# Altium footprint library JEDEC_G.PcbLib: 194 footprints (part 6 of 13)
Each footprint in its own frame and in the unit in brackets; x right, y up, seen from the top. Pads: shape width x height; smd on the part's side, far side on the other; paste and mask are expansions set on the pad; w line width, h text height; cw(c..) or ccw(c..) is an arc to the next point about the centre after c.
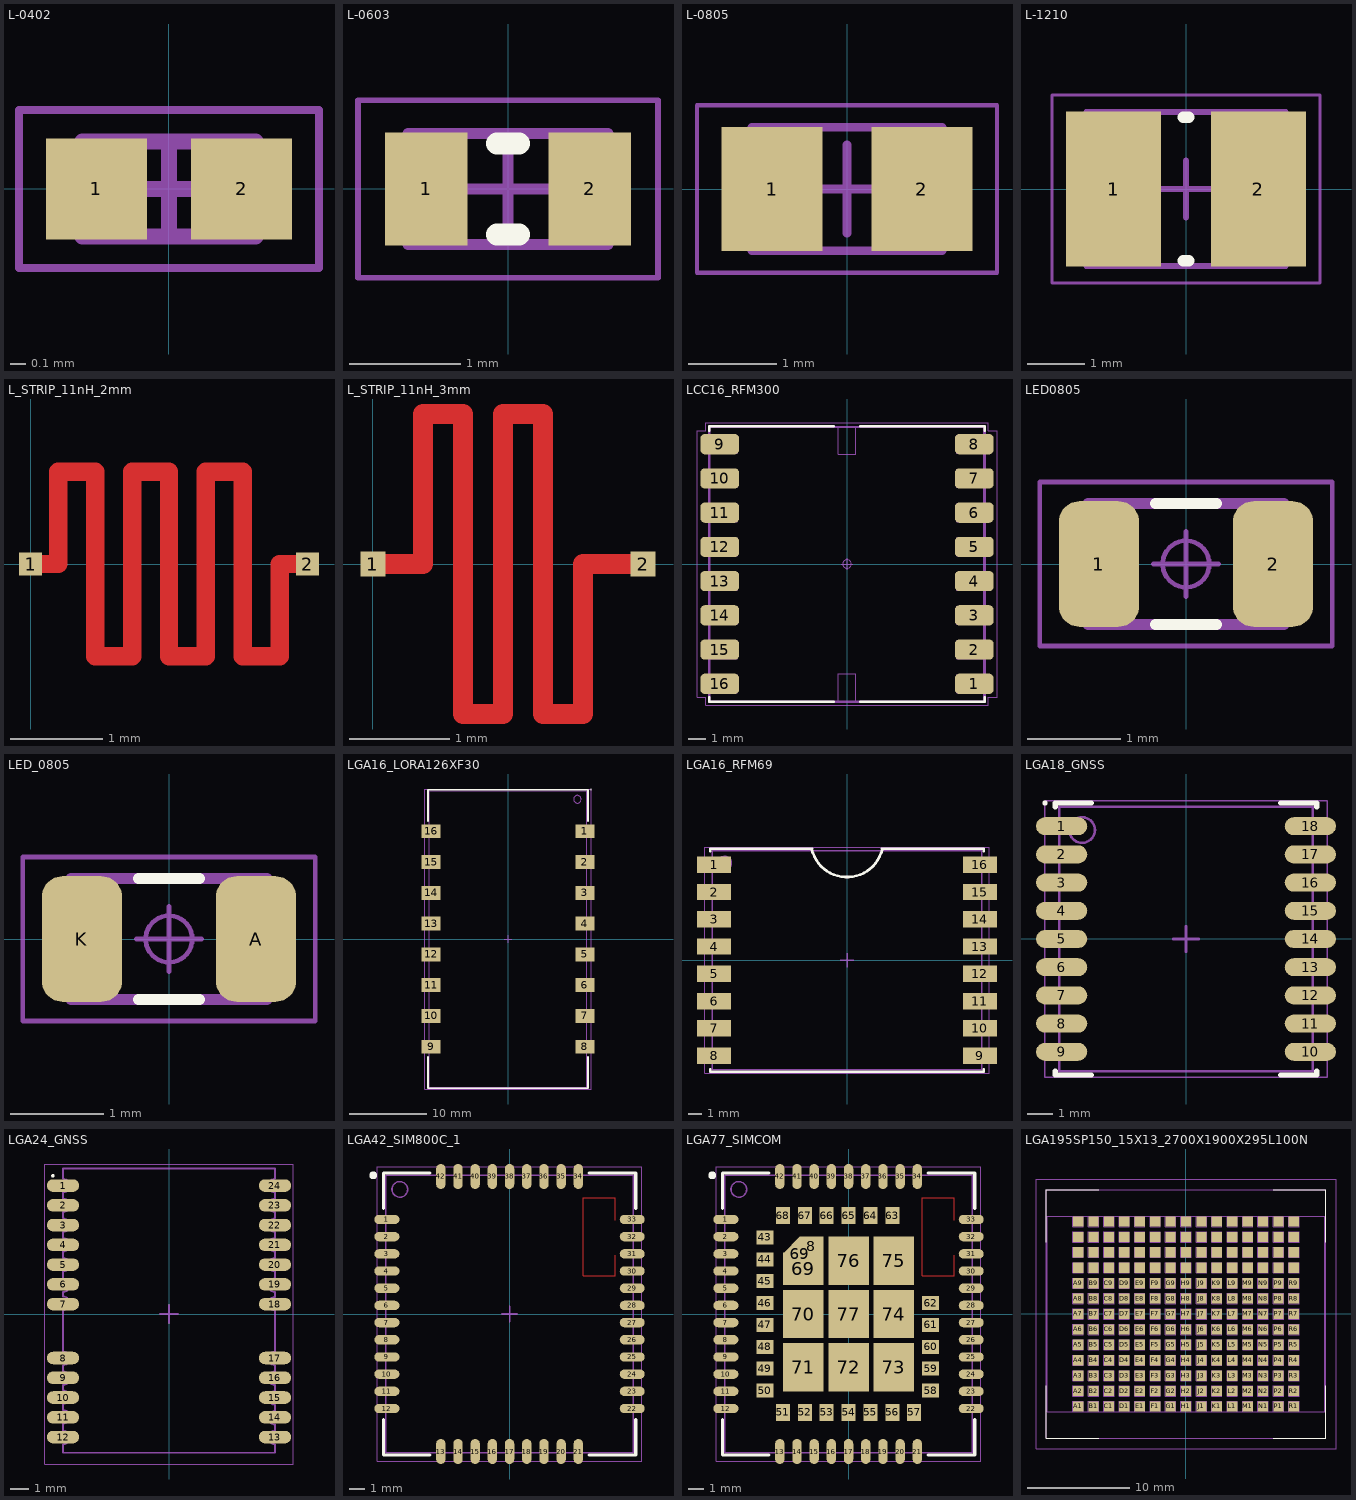
[diagram p5: the footprints below, top view; thin cyan lines are the x and y axes]

## L-0402 [mm]
pads (2):
  rect 0.64x0.64 smd: 1(-0.46,0) 2(0.46,0)
Mechanical 13:
  lines w0.1: -0.55,-0.3 -0.55,0.3 0.55,0.3 0.55,-0.3 -0.55,-0.3
Mechanical 15:
  lines w0.05: -0.95,-0.5 -0.95,0.5 0.95,0.5 0.95,-0.5 -0.95,-0.5
  lines w0.1: -0.3,0 0.3,0 ; 0,-0.3 0,0.3
3D body: height 0.6, standoff 0, extent -0.35,-0.3 0.35,0.3
3D body: height 0.6, standoff 0, extent 0.35,-0.3 0.55,0.3
3D body: height 0.6, standoff 0, extent -0.55,-0.3 -0.35,0.3

## L-0603 [mm] "Chip Inductor, 2-Leads, Body 1,60x0,80mm, IPC Medium Density"
height 1
pads (2):
  rect 0.74x1.02 smd: 1(-0.735,0) 2(0.735,0)
Top Overlay:
  lines w0.2: -0.1,-0.41 0.1,-0.41 ; -0.1,0.41 0.1,0.41
Mechanical 13:
  lines w0.1: -0.9,-0.5 0.9,-0.5 0.9,0.5 -0.9,0.5 -0.9,-0.5
Mechanical 15:
  lines w0.05: -1.35,-0.8 1.35,-0.8 1.35,0.8 -1.35,0.8 -1.35,-0.8
  lines w0.1: -0.5,0 0.5,0 ; 0,-0.5 0,0.5
3D body "INDC1608X10N.step": height 1, standoff 0, extent -0.9,-0.5 0.9,0.5

## L-0805 [mm] "Chip Inductor 2-Leads, Body 2,00x1,25mm, IPC Medium Density"
height 1
pads (2):
  rect 1.15x1.4 smd: 1(-0.85,0) 2(0.85,0)
Mechanical 13:
  lines w0.1: -1.075,-0.7 1.075,-0.7 1.075,0.7 -1.075,0.7 -1.075,-0.7
Mechanical 15:
  lines w0.05: -1.7,-0.95 1.7,-0.95 1.7,0.95 -1.7,0.95 -1.7,-0.95
  lines w0.1: -0.5,0 0.5,0 ; 0,-0.5 0,0.5
3D body "L_0805_2012Metric.step": height 1.25, standoff 0, extent -1,-0.625 1,0.625

## L-1210 [mm] "Chip Inductor, 2-Leads, Body 3,20x2,50mm, IPC Medium Density"
height 2.2
pads (2):
  rect 1.67x2.72 smd: 1(-1.27,0) 2(1.27,0)
Top Overlay:
  lines w0.2: -0.05,-1.26 0.05,-1.26 ; -0.05,1.26 0.05,1.26
Mechanical 13:
  lines w0.1: -1.75,-1.35 -1.75,1.35 1.75,1.35 1.75,-1.35 -1.75,-1.35
Mechanical 15:
  lines w0.05: -2.35,-1.65 -2.35,1.65 2.35,1.65 2.35,-1.65 -2.35,-1.65
  lines w0.1: -0.5,0 0.5,0 ; 0,-0.5 0,0.5
3D body: height 2.2, standoff 0, extent -0.85,-1.35 0.85,1.35
3D body: height 2.2, standoff 0, extent -1.75,-1.35 -0.85,1.35
3D body: height 2.2, standoff 0, extent 0.85,-1.35 1.75,1.35

## L_STRIP_11nH_2mm [mm]
pads (2):
  rect 0.25x0.25 smd: 1(0,0) 2(3,0)
Top Layer:
  lines w0.2: 0,0 0.3,0 0.3,1 0.7,1 0.7,-1 1.1,-1 1.1,1 1.5,1 1.5,-1 1.9,-1 1.9,1 2.3,1 2.3,-1 2.7,-1 2.7,0 3,0

## L_STRIP_11nH_3mm [mm]
pads (2):
  rect 0.25x0.25 smd: 1(0,0) 2(2.7,0)
Top Layer:
  lines w0.2: 0,0 0.5,0 0.5,1.5 0.9,1.5 0.9,-1.5 1.3,-1.5 1.3,1.5 1.7,1.5 1.7,-1.5 2.1,-1.5 2.1,0 2.7,0

## LCC16_RFM300 [mm] "Leadless Chip Carrier (LCC), 2.00 mm pitch; square, 1 pin X 8 pin, 16.00 mm L X 16.00 mm W X 1.90 mm H body"
height 1.9
pads (16):
  rrect42% 2.26x1.18 smd: 1(7.435,-7) 2(7.435,-5) 3(7.435,-3) 4(7.435,-1) 5(7.435,1) 6(7.435,3) 7(7.435,5) 8(7.435,7) 9(-7.435,7) 10(-7.435,5) 11(-7.435,3) 12(-7.435,1) 13(-7.435,-1) 14(-7.435,-3) 15(-7.435,-5) 16(-7.435,-7)
Top Overlay:
  lines w0.12: -8.05,-7.77 -8.05,-8.05 -0.77,-8.05 ; -8.05,7.77 -8.05,8.05 -0.77,8.05 ; 0.77,-8.05 8.05,-8.05 8.05,-7.77 ; 0.77,8.05 8.05,8.05 8.05,7.77
Mechanical 11:
  lines w0.12: -8.05,-8.05 -8.05,8 8.05,8 8.05,-8.05 -8.05,-8.05
Mechanical 12:
  lines w0.025: -8,-8 -8,8 8,8 8,-8 -8,-8 ; -8,-7.525 -6.4,-7.525 -6.4,-6.475 -8,-6.475 -8,-7.525 ; -8,-5.525 -6.4,-5.525 -6.4,-4.475 -8,-4.475 -8,-5.525 ; -8,-3.525 -6.4,-3.525 -6.4,-2.475 -8,-2.475 -8,-3.525 ; -8,-1.525 -6.4,-1.525 -6.4,-0.475 -8,-0.475 -8,-1.525 ; -8,0.475 -6.4,0.475 -6.4,1.525 -8,1.525 -8,0.475 ; -8,2.475 -6.4,2.475 -6.4,3.525 -8,3.525 -8,2.475 ; -8,4.475 -6.4,4.475 -6.4,5.525 -8,5.525 -8,4.475 ; -8,6.475 -6.4,6.475 -6.4,7.525 -8,7.525 -8,6.475 ; -0.525,-8 0.525,-8 0.525,-6.4 -0.525,-6.4 -0.525,-8 ; -0.525,6.4 0.525,6.4 0.525,8 -0.525,8 -0.525,6.4 ; 6.4,-7.525 6.4,-6.475 8,-6.475 8,-7.525 6.4,-7.525 ; 6.4,-5.525 6.4,-4.475 8,-4.475 8,-5.525 6.4,-5.525 ; 6.4,-3.525 6.4,-2.475 8,-2.475 8,-3.525 6.4,-3.525 ; 6.4,-1.525 6.4,-0.475 8,-0.475 8,-1.525 6.4,-1.525 ; 6.4,0.475 6.4,1.525 8,1.525 8,0.475 6.4,0.475 ; 6.4,2.475 6.4,3.525 8,3.525 8,2.475 6.4,2.475 ; 6.4,4.475 6.4,5.525 8,5.525 8,4.475 6.4,4.475 ; 6.4,6.475 6.4,7.525 8,7.525 8,6.475 6.4,6.475
Mechanical 15:
  circle w0.05: c0,0 r0.25
  lines w0.05: -0.35,0 0.35,0 ; 0,-0.35 0,0.35 ; -8.765,-7.79 -8.765,7.79 -8.25,7.79 -8.25,8.25 -0.79,8.25 0.79,8.25 8.25,8.25 8.25,7.79 8.765,7.79 8.765,-7.79 8.25,-7.79 8.25,-8.25 0.79,-8.25 -0.79,-8.25 -8.25,-8.25 -8.25,-7.79 -8.765,-7.79
Mechanical 16:
  text ".Designator" at 0,0 h1.2
3D body "LCC16_RFM300.STEP": height 1.9, standoff 0, extent -8.05,-8.05 8.05,8.05

## LED0805 [mm] "LED, Chip; 2.00 mm L X 1.25 mm W X 0.80 mm H body"
height 0.8
pads (2):
  rrect51% 0.86x1.35 smd: 1(-0.935,0) 2(0.935,0)
Top Overlay:
  lines w0.12: -0.325,-0.65 0.325,-0.65 ; -0.325,0.65 0.325,0.65
Mechanical 11:
  lines w0.12: -1.05,-0.65 -1.05,0.65 1.05,0.65 1.05,-0.65 -1.05,-0.65
Mechanical 12:
  lines w0.025: -1,-0.625 -0.6,-0.625 -0.6,0.625 -1,0.625 ; -1,-0.625 -1,0.625 ; -1,-0.625 -1,0.625 ; -1,-0.625 1,-0.625 ; -1,0.625 1,0.625 ; 1,-0.625 1,0.625 ; 1,-0.625 0.6,-0.625 0.6,0.625 1,0.625 ; 1,-0.625 1,0.625
Mechanical 15:
  circle w0.05: c0,0 r0.25
  lines w0.05: -0.35,0 0.35,0 ; 0,-0.35 0,0.35 ; -1.57,-0.88 -1.57,0.88 1.57,0.88 1.57,-0.88 -1.57,-0.88
3D body: height 0.25, standoff 0, extent -1,-0.625 1,0.625

## LED_0805 [mm] "LED, Chip; 2.00 mm L X 1.25 mm W X 0.80 mm H body"
height 0.8
pads (2):
  rrect51% 0.86x1.35 smd: A(0.935,0) K(-0.935,0)
Top Overlay:
  lines w0.12: -0.325,-0.65 0.325,-0.65 ; -0.325,0.65 0.325,0.65
Mechanical 11:
  lines w0.12: -1.05,-0.65 -1.05,0.65 1.05,0.65 1.05,-0.65 -1.05,-0.65
Mechanical 12:
  lines w0.025: -1,-0.625 -0.6,-0.625 -0.6,0.625 -1,0.625 ; -1,-0.625 -1,0.625 ; -1,-0.625 -1,0.625 ; -1,-0.625 1,-0.625 ; -1,0.625 1,0.625 ; 1,-0.625 1,0.625 ; 1,-0.625 0.6,-0.625 0.6,0.625 1,0.625 ; 1,-0.625 1,0.625
Mechanical 15:
  circle w0.05: c0,0 r0.25
  lines w0.05: -0.35,0 0.35,0 ; 0,-0.35 0,0.35 ; -1.57,-0.88 -1.57,0.88 1.57,0.88 1.57,-0.88 -1.57,-0.88
3D body: height 0.25, standoff 0, extent -1,-0.625 1,0.625

## LGA16_LORA126XF30 [mm]
height 4.05
pads (16):
  rect 2.5x1.8 smd: 1(10,14) 2(10,10) 3(10,6) 4(10,2) 5(10,-2) 6(10,-6) 7(10,-10) 8(10,-14) 9(-10,-14) 10(-10,-10) 11(-10,-6) 12(-10,-2) 13(-10,2) 14(-10,6) 15(-10,10) 16(-10,14)
Top Overlay:
  circle w0.1: c10.795,19.431 r0.05
  lines w0.2: -10.4,-15.3 -10.4,-19.4 10.4,-19.4 10.4,-15.3 ; -10.4,15.3 -10.4,19.4 10.4,19.4 10.4,15.3
Top Courtyard:
  lines w0.05: -10.8,-19.5 10.8,-19.5 10.8,19.5 -10.8,19.5 -10.8,-19.5
  lines w0.1: -0.5,0 0.5,0 ; 0,-0.5 0,0.5
Top Assembly:
  circle w0.1: c9.017,18.161 r0.5
  lines w0.1: -10.25,-19.25 10.25,-19.25 10.25,19.25 -10.25,19.25 -10.25,-19.25
3D body "LGA16_LORA126XF30.step": height 4.05, standoff 0.1, extent -10.25,-19.25 10.25,19.25

## LGA16_RFM69 [mm] "LGA, 16-Leads, RFM69HW"
height 2
pads (16):
  rect 2.5x1.2 smd: 1(-9.75,7) 2(-9.75,5) 3(-9.75,3) 4(-9.75,1) 5(-9.75,-1) 6(-9.75,-3) 7(-9.75,-5) 8(-9.75,-7) 9(9.75,-7) 10(9.75,-5) 11(9.75,-3) 12(9.75,-1) 13(9.75,1) 14(9.75,3) 15(9.75,5) 16(9.75,7)
Top Overlay:
  lines w0.2: -10.025,-8 -10.025,-8.175 10.025,-8.175 10.025,-8 ; -10.025,8 -10.025,8.175 -2.575,8.175 ; -2.575,8.095 ccw(c0,8.75) 2.575,8.095 ; 2.575,8.175 10.025,8.175 10.025,8
Mechanical 13:
  circle w0.1: c-8.975,7.125 r0.5
  lines w0.1: -9.875,-8.025 9.875,-8.025 9.875,8.025 -9.875,8.025 -9.875,-8.025
Mechanical 15:
  lines w0.05: -10.435,-8.3 10.435,-8.3 10.435,8.3 -10.435,8.3 -10.435,-8.3
  lines w0.1: -0.5,0 0.5,0 ; 0,-0.5 0,0.5
3D body "RFM69W.STEP": height 2, standoff 0.1, extent -9.85,-8 9.85,8

## LGA18_GNSS [mm] "8-Leads, Body 10,10x9,70mm, Pitch 1,10mm"
height 2.6
pads (18):
  oval 2x0.7 smd mask+0.1: 1(-4.85,4.4) 2(-4.85,3.3) 3(-4.85,2.2) 4(-4.85,1.1) 5(-4.85,0) 6(-4.85,-1.1) 7(-4.85,-2.2) 8(-4.85,-3.3) 9(-4.85,-4.4) 10(4.85,-4.4) 11(4.85,-3.3) 12(4.85,-2.2) 13(4.85,-1.1) 14(4.85,0) 15(4.85,1.1) 16(4.85,2.2) 17(4.85,3.3) 18(4.85,4.4)
Top Overlay:
  circle w0.1: c-5.5,5.3 r0.05
  lines w0.2: -5.1,-5.15 -5.1,-5.3 -3.695,-5.3 ; -5.1,5.15 -5.1,5.3 -3.695,5.3 ; 3.695,-5.3 5.1,-5.3 5.1,-5.15 ; 3.695,5.3 5.1,5.3 5.1,5.15
Mechanical 13:
  circle w0.1: c-4.05,4.25 r0.5
  lines w0.1: -4.95,-5.15 4.95,-5.15 4.95,5.15 -4.95,5.15 -4.95,-5.15
Mechanical 15:
  lines w0.05: -5.505,-5.4 5.505,-5.4 5.505,5.4 -5.505,5.4 -5.505,-5.4
  lines w0.1: -0.5,0 0.5,0 ; 0,-0.5 0,0.5
3D body: height 2.6, standoff 0, extent -4.95,-5.15 4.95,5.15

## LGA24_GNSS [mm]
height 3.4
pads (24):
  oval 1.8x0.7 smd: 1(-5.9,7.15) 2(-5.9,6.05) 3(-5.9,4.95) 4(-5.9,3.85) 5(-5.9,2.75) 6(-5.9,1.65) 7(-5.9,0.55) 8(-5.9,-2.45) 9(-5.9,-3.55) 10(-5.9,-4.65) 11(-5.9,-5.75) 12(-5.9,-6.85) 13(5.9,-6.85) 14(5.9,-5.75) 15(5.9,-4.65) 16(5.9,-3.55) 17(5.9,-2.45) 18(5.9,0.55) 19(5.9,1.65) 20(5.9,2.75) 21(5.9,3.85) 22(5.9,4.95) 23(5.9,6.05) 24(5.9,7.15)
Top Overlay:
  circle w0.1: c-6.462,7.688 r0.05
Mechanical 13:
  lines w0.1: -5.9,1.973 cw(c-5.9,1.6) -5.9,1.227 -5.9,0.975 cw(c-5.9,0.6) -5.9,0.225 -5.9,-1.75 -5.9,-2.1 cw(c-5.9,-2.475) -5.9,-2.85 -5.9,-3.2 cw(c-5.9,-3.575) -5.9,-3.95 -5.9,-4.25 cw(c-5.9,-4.625) -5.9,-5 -5.9,-5.35 cw(c-5.9,-5.725) -5.9,-6.1 -5.9,-6.5 cw(c-5.9,-6.875) -5.9,-7.25 -5.9,-7.725 5.9,-7.725 5.9,-7.25 cw(c5.9,-6.875) 5.9,-6.5 5.9,-6.15 cw(c5.9,-5.775) 5.9,-5.4 5.9,-5.05 cw(c5.9,-4.675) 5.9,-4.3 5.9,-3.95 cw(c5.9,-3.575) 5.9,-3.2 5.9,-2.85 cw(c5.9,-2.475) 5.9,-2.1 5.9,-1.75 5.9,0.2 cw(c5.9,0.575) 5.9,0.95 5.9,1.225 cw(c5.9,1.6) 5.9,1.975 ; -5.9,2.025 -5.9,2.375 ccw(c-5.9,2.75) -5.9,3.125 -5.9,3.475 ccw(c-5.9,3.85) -5.9,4.225 -5.9,4.575 ccw(c-5.9,4.95) -5.9,5.325 -5.9,5.675 ccw(c-5.9,6.05) -5.9,6.425 -5.9,6.775 ccw(c-5.9,7.15) -5.9,7.525 -5.9,8.1 5.9,8.1 5.9,7.525 ccw(c5.9,7.15) 5.9,6.775 5.9,6.425 ccw(c5.9,6.05) 5.9,5.675 5.9,5.325 ccw(c5.9,4.95) 5.9,4.575 5.9,4.225 ccw(c5.9,3.85) 5.9,3.475 5.9,3.125 ccw(c5.9,2.75) 5.9,2.375 5.9,2.025
Mechanical 15:
  lines w0.05: -6.91,-8.35 -6.91,8.35 6.91,8.35 6.91,-8.35 -6.91,-8.35
  lines w0.1: -0.5,0 0.5,0 ; 0,-0.5 0,0.5
3D body: height 3.4, standoff 0, extent -6.2,-7.7 6.2,8.1

## LGA42_SIM800C_1 [mm] "SIM800C module"
height 2.5
pads (42):
  oval 1.6x0.6 smd: 1(-7.85,6.05) 2(-7.85,4.95) 3(-7.85,3.85) 4(-7.85,2.75) 5(-7.85,1.65) 6(-7.85,0.55) 7(-7.85,-0.55) 8(-7.85,-1.65) 9(-7.85,-2.75) 10(-7.85,-3.85) 11(-7.85,-4.95) 12(-7.85,-6.05) 22(7.85,-6.05) 23(7.85,-4.95) 24(7.85,-3.85) 25(7.85,-2.75) 26(7.85,-1.65) 27(7.85,-0.55) 28(7.85,0.55) 29(7.85,1.65) 30(7.85,2.75) 31(7.85,3.85) 32(7.85,4.95) 33(7.85,6.05)
  oval 0.6x1.6 smd: 13(-4.4,-8.8) 14(-3.3,-8.8) 15(-2.2,-8.8) 16(-1.1,-8.8) 17(0,-8.8) 18(1.1,-8.8) 19(2.2,-8.8) 20(3.3,-8.8) 21(4.4,-8.8) 34(4.4,8.8) 35(3.3,8.8) 36(2.2,8.8) 37(1.1,8.8) 38(0,8.8) 39(-1.1,8.8) 40(-2.2,8.8) 41(-3.3,8.8) 42(-4.4,8.8)
Top Layer:
  lines w0.05: 6.75,3.75 6.75,2.45 4.7,2.45 4.7,7.45 6.75,7.45 6.75,6
Top Overlay:
  circle w0.25: c-8.725,8.875 r0.125
  lines w0.2: -8.075,-6.75 -8.075,-9.025 -5.1,-9.025 ; -8.075,6.75 -8.075,9.025 -5.1,9.025 ; 5.1,-9.025 8.075,-9.025 8.075,-6.75 ; 5.1,9.025 8.075,9.025 8.075,6.75
Mechanical 13:
  circle w0.1: c-7.025,7.975 r0.5
  lines w0.1: -7.925,-8.875 -7.925,8.875 7.925,8.875 7.925,-8.875 -7.925,-8.875
Mechanical 15:
  lines w0.05: -8.475,-9.425 -8.475,9.425 8.475,9.425 8.475,-9.425 -8.475,-9.425
  lines w0.1: -0.5,0 0.5,0 ; 0,-0.5 0,0.5
3D body: height 2.5, standoff 0.01, extent -7.925,-8.875 7.925,8.875

## LGA77_SIMCOM [mm] "SIM868 module"
height 2.5
pads (79):
  oval 1.6x0.6 smd: 1(-7.85,6.05) 2(-7.85,4.95) 3(-7.85,3.85) 4(-7.85,2.75) 5(-7.85,1.65) 6(-7.85,0.55) 7(-7.85,-0.55) 8(-7.85,-1.65) 9(-7.85,-2.75) 10(-7.85,-3.85) 11(-7.85,-4.95) 12(-7.85,-6.05) 22(7.85,-6.05) 23(7.85,-4.95) 24(7.85,-3.85) 25(7.85,-2.75) 26(7.85,-1.65) 27(7.85,-0.55) 28(7.85,0.55) 29(7.85,1.65) 30(7.85,2.75) 31(7.85,3.85) 32(7.85,4.95) 33(7.85,6.05)
  rect 1.55x1.2 smd: 8(-2.375,4.35)
  oval 0.6x1.6 smd: 13(-4.4,-8.8) 14(-3.3,-8.8) 15(-2.2,-8.8) 16(-1.1,-8.8) 17(0,-8.8) 18(1.1,-8.8) 19(2.2,-8.8) 20(3.3,-8.8) 21(4.4,-8.8) 34(4.4,8.8) 35(3.3,8.8) 36(2.2,8.8) 37(1.1,8.8) 38(0,8.8) 39(-1.1,8.8) 40(-2.2,8.8) 41(-3.3,8.8) 42(-4.4,8.8)
  rect 1.1x0.9 smd: 43(-5.35,4.9) 44(-5.35,3.5) 45(-5.35,2.1) 46(-5.35,0.7) 47(-5.35,-0.7) 48(-5.35,-2.1) 49(-5.35,-3.5) 50(-5.35,-4.9) 58(5.25,-4.9) 59(5.25,-3.5) 60(5.25,-2.1) 61(5.25,-0.7) 62(5.25,0.7)
  rect 0.9x1.1 smd: 51(-4.2,-6.3) 52(-2.8,-6.3) 53(-1.4,-6.3) 54(0,-6.3) 55(1.4,-6.3) 56(2.8,-6.3) 57(4.2,-6.3) 63(2.8,6.3) 64(1.4,6.3) 65(0,6.3) 66(-1.4,6.3) 67(-2.8,6.3) 68(-4.2,6.3)
  rect 1.55x1.55 smd rot 45: 69(-3.12,3.87)
  rect 2.6x2.07 smd: 69(-2.9,2.885)
  rect 2.6x3.1 smd: 70(-2.9,0) 71(-2.9,-3.4) 72(0,-3.4) 73(2.9,-3.4) 74(2.9,0) 75(2.9,3.4) 76(0,3.4) 77(0,0)
Top Layer:
  lines w0.05: 6.75,3.75 6.75,2.45 4.7,2.45 4.7,7.45 6.75,7.45 6.75,6
Top Overlay:
  circle w0.25: c-8.725,8.875 r0.125
  lines w0.2: -8.075,-6.75 -8.075,-9.025 -5.1,-9.025 ; -8.075,6.75 -8.075,9.025 -5.1,9.025 ; 5.1,-9.025 8.075,-9.025 8.075,-6.75 ; 5.1,9.025 8.075,9.025 8.075,6.75
Mechanical 13:
  circle w0.1: c-7.025,7.975 r0.5
  lines w0.1: -7.925,-8.875 -7.925,8.875 7.925,8.875 7.925,-8.875 -7.925,-8.875
Mechanical 15:
  lines w0.05: -8.475,-9.425 -8.475,9.425 8.475,9.425 8.475,-9.425 -8.475,-9.425
  lines w0.1: -0.5,0 0.5,0 ; 0,-0.5 0,0.5
3D body: height 2.5, standoff 0.01, extent -7.6,-8.875 8.25,8.875

## LGA195SP150_15X13_2700X1900X295L100N [mm] "Land Grid Array (LGA), 1.50 mm pitch, rect.; 195 pin, 27.00 mm L X 19.00 mm W X 2.95 mm H body"
height 2.95
pads (195):
  rect 1x1 smd: A1(-10.5,-9) A2(-10.5,-7.5) A3(-10.5,-6) A4(-10.5,-4.5) A5(-10.5,-3) A6(-10.5,-1.5) A7(-10.5,0) A8(-10.5,1.5) A9(-10.5,3) A10(-10.5,4.5) A11(-10.5,6) A12(-10.5,7.5) A13(-10.5,9) B1(-9,-9) B2(-9,-7.5) B3(-9,-6) B4(-9,-4.5) B5(-9,-3) B6(-9,-1.5) B7(-9,0) B8(-9,1.5) B9(-9,3) B10(-9,4.5) B11(-9,6) B12(-9,7.5) B13(-9,9) C1(-7.5,-9) C2(-7.5,-7.5) C3(-7.5,-6) C4(-7.5,-4.5) C5(-7.5,-3) C6(-7.5,-1.5) C7(-7.5,0) C8(-7.5,1.5) C9(-7.5,3) C10(-7.5,4.5) C11(-7.5,6) C12(-7.5,7.5) C13(-7.5,9) D1(-6,-9) D2(-6,-7.5) D3(-6,-6) D4(-6,-4.5) D5(-6,-3) D6(-6,-1.5) D7(-6,0) D8(-6,1.5) D9(-6,3) D10(-6,4.5) D11(-6,6) D12(-6,7.5) D13(-6,9) E1(-4.5,-9) E2(-4.5,-7.5) E3(-4.5,-6) E4(-4.5,-4.5) E5(-4.5,-3) E6(-4.5,-1.5) E7(-4.5,0) E8(-4.5,1.5) E9(-4.5,3) E10(-4.5,4.5) E11(-4.5,6) E12(-4.5,7.5) E13(-4.5,9) F1(-3,-9) F2(-3,-7.5) F3(-3,-6) F4(-3,-4.5) F5(-3,-3) F6(-3,-1.5) F7(-3,0) F8(-3,1.5) F9(-3,3) F10(-3,4.5) F11(-3,6) F12(-3,7.5) F13(-3,9) G1(-1.5,-9) G2(-1.5,-7.5) G3(-1.5,-6) G4(-1.5,-4.5) G5(-1.5,-3) G6(-1.5,-1.5) G7(-1.5,0) G8(-1.5,1.5) G9(-1.5,3) G10(-1.5,4.5) G11(-1.5,6) G12(-1.5,7.5) G13(-1.5,9) H1(0,-9) H2(0,-7.5) H3(0,-6) H4(0,-4.5) H5(0,-3) H6(0,-1.5) H7(0,0) H8(0,1.5) H9(0,3) H10(0,4.5) H11(0,6) H12(0,7.5) H13(0,9) J1(1.5,-9) J2(1.5,-7.5) J3(1.5,-6) J4(1.5,-4.5) J5(1.5,-3) J6(1.5,-1.5) J7(1.5,0) J8(1.5,1.5) J9(1.5,3) J10(1.5,4.5) J11(1.5,6) J12(1.5,7.5) J13(1.5,9) K1(3,-9) K2(3,-7.5) K3(3,-6) K4(3,-4.5) K5(3,-3) K6(3,-1.5) K7(3,0) K8(3,1.5) K9(3,3) K10(3,4.5) K11(3,6) K12(3,7.5) K13(3,9) L1(4.5,-9) L2(4.5,-7.5) L3(4.5,-6) L4(4.5,-4.5) L5(4.5,-3) L6(4.5,-1.5) L7(4.5,0) L8(4.5,1.5) L9(4.5,3) L10(4.5,4.5) L11(4.5,6) L12(4.5,7.5) L13(4.5,9) M1(6,-9) M2(6,-7.5) M3(6,-6) M4(6,-4.5) M5(6,-3) M6(6,-1.5) M7(6,0) M8(6,1.5) M9(6,3) M10(6,4.5) M11(6,6) M12(6,7.5) M13(6,9) N1(7.5,-9) N2(7.5,-7.5) N3(7.5,-6) N4(7.5,-4.5) N5(7.5,-3) N6(7.5,-1.5) N7(7.5,0) N8(7.5,1.5) N9(7.5,3) N10(7.5,4.5) N11(7.5,6) N12(7.5,7.5) N13(7.5,9) P1(9,-9) P2(9,-7.5) P3(9,-6) P4(9,-4.5) P5(9,-3) P6(9,-1.5) P7(9,0) P8(9,1.5) P9(9,3) P10(9,4.5) P11(9,6) P12(9,7.5) P13(9,9) R1(10.5,-9) R2(10.5,-7.5) R3(10.5,-6) R4(10.5,-4.5) R5(10.5,-3) R6(10.5,-1.5) R7(10.5,0) R8(10.5,1.5) R9(10.5,3) R10(10.5,4.5) R11(10.5,6) R12(10.5,7.5) R13(10.5,9)
Top Overlay:
  lines w0.12: -13.58,-7 -13.58,-12.08 -8.5,-12.08 ; -13.58,7 -13.58,12.08 -8.5,12.08 ; 8.5,-12.08 13.58,-12.08 13.58,-7 ; 8.5,12.08 13.58,12.08 13.58,7
Mechanical 11:
  lines w0.12: -13.58,-12.08 13.58,-12.08 13.58,12.08 -13.58,12.08 -13.58,-12.08
Mechanical 12:
  drawing of 784 lines, arcs and shapes, not listed
Mechanical 15:
  circle w0.05: c0,0 r0.25
  lines w0.05: -0.35,0 0.35,0 ; 0,-0.35 0,0.35 ; -14.6,-13.1 14.6,-13.1 14.6,13.1 -14.6,13.1 -14.6,-13.1
Mechanical 16:
  text ".Designator" at 0,0 h1.2
3D body "LGA195SP150_15X13_2700X1900X295L100.STEP": height 2.95, standoff 0, extent -13.5,-9.5 13.5,9.5